# Altium schematic symbol library hphonglib.SchLib: 1131 symbols (part 2 of 8)
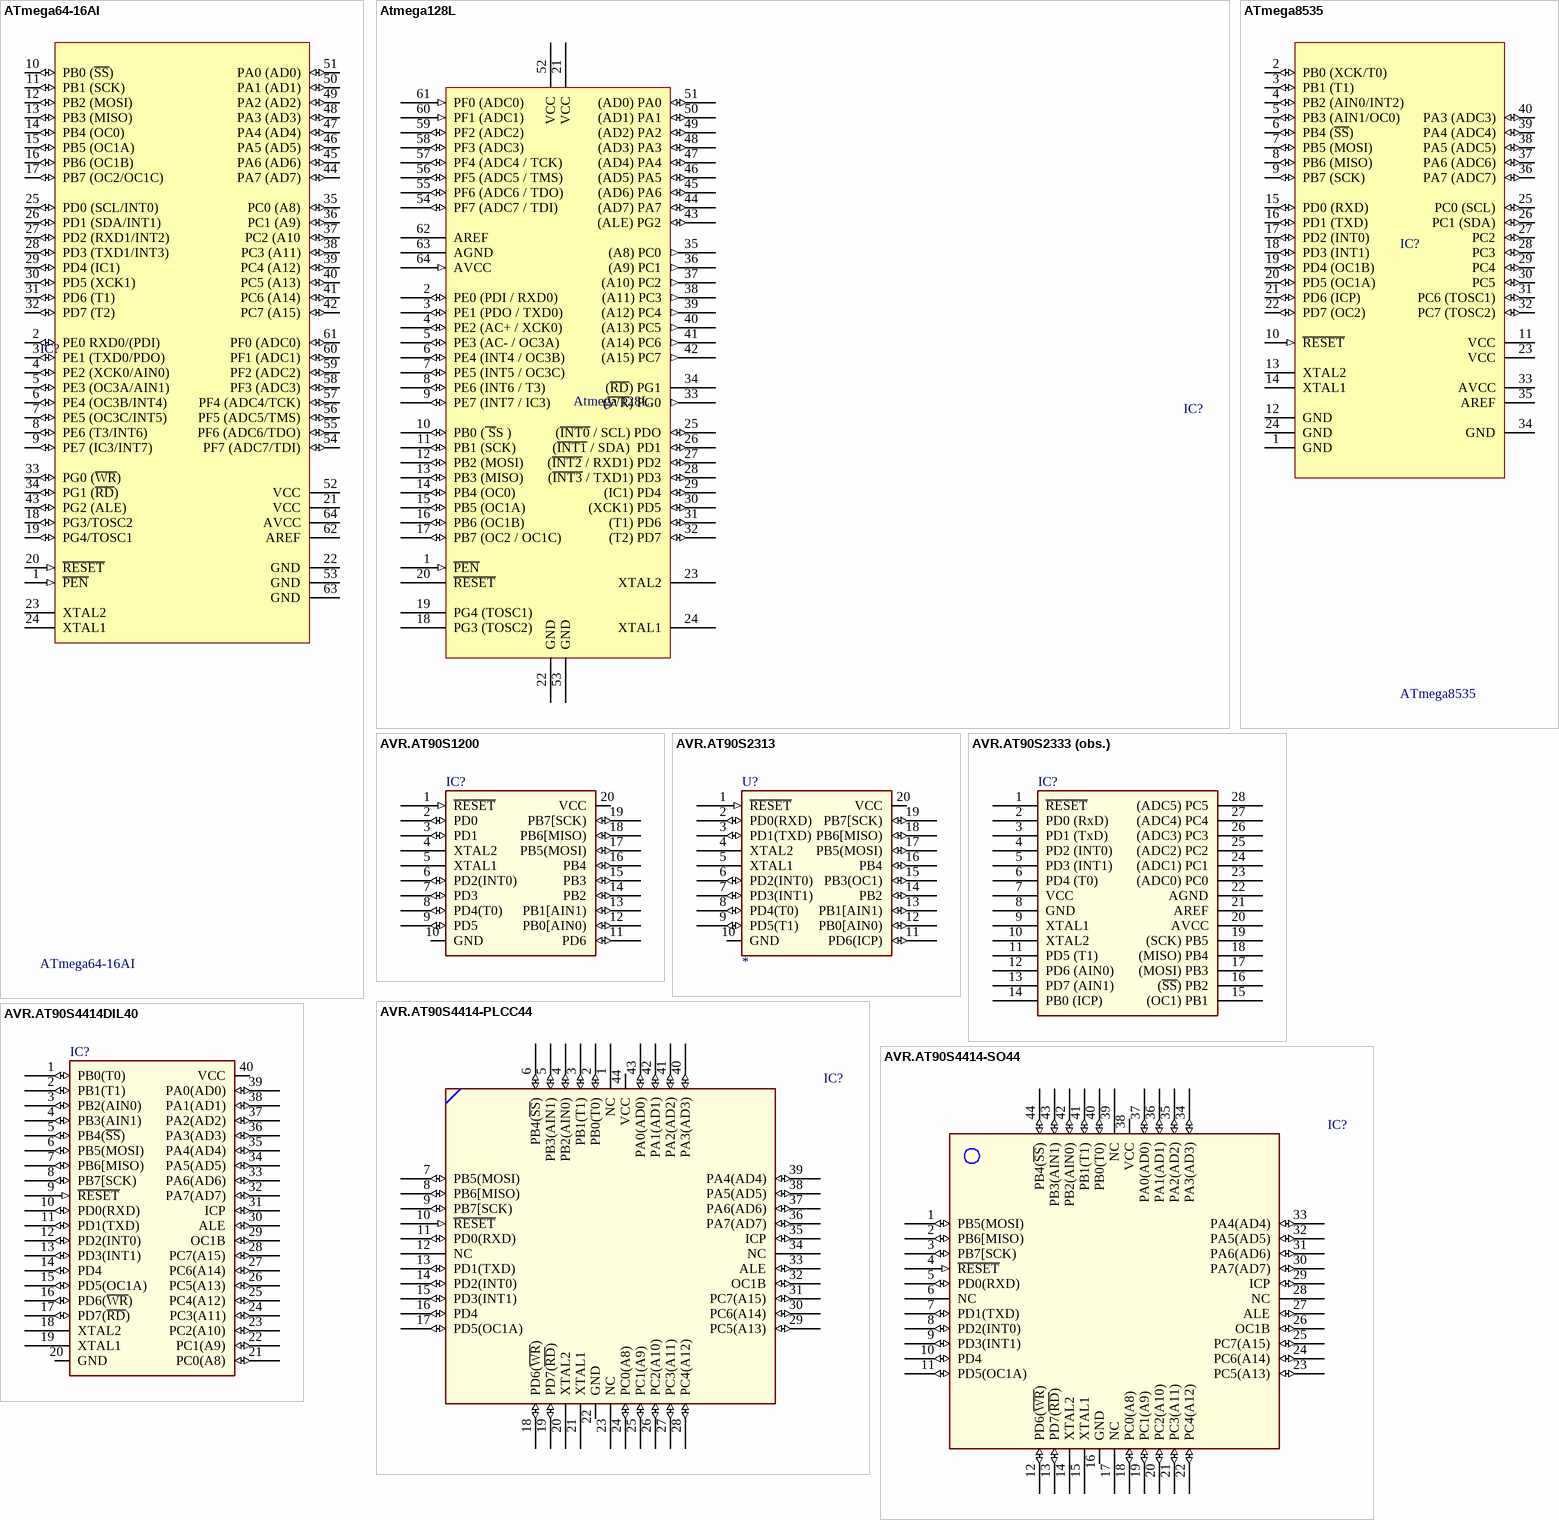
[diagram p50: symbols ATmega64-16AI to AVR.AT90S4414DIL40]

## AVR.AT90S2313
designator U?
Manufacturer: Atmel; Flash: Kb; SRAM: Bytes; Volt: V; CPU Speed (MIPS): 0 MIPS; ComponentLink1Description: Degikey Part link; ComponentLink2Description: Open DataSheet; ComponentLink2URL: H:\LIBRARY\LIBRARY.Datasheet\; Publisher: Hoang Nguyen
pins: 1 ~{RESET} (in), 2 PD0(RXD) (io), 3 PD1(TXD) (io), 4 XTAL2, 5 XTAL1, 6 PD2(INT0) (io), 7 PD3(INT1) (io), 8 PD4(T0) (io), 9 PD5(T1) (io), 10 GND, 11 PD6(ICP) (io), 12 PB0[AIN0) (io), 13 PB1[AIN1) (io), 14 PB2 (io), 15 PB3(OC1) (io), 16 PB4 (io), 17 PB5(MOSI) (io), 18 PB6[MISO) (io), 19 PB7[SCK) (io), 20 VCC

## AVR.AT90S2333 (obs.)
designator IC?  (value not drawn)
Manufacturer: Atmel; Flash: Kb; SRAM: Bytes; Volt: V; CPU Speed (MIPS): 0 MIPS; ComponentLink1Description: Degikey Part link; ComponentLink2Description: Open DataSheet; ComponentLink2URL: H:\LIBRARY\LIBRARY.Datasheet\; Publisher: Hoang Nguyen
footprint DIL28
pins: 1 ~{RESET} (hiz), 2 PD0 (RxD) (hiz), 3 PD1 (TxD) (hiz), 4 PD2 (INT0) (hiz), 5 PD3 (INT1) (hiz), 6 PD4 (T0) (hiz), 7 VCC, 8 GND, 9 XTAL1 (hiz), 10 XTAL2 (hiz), 11 PD5 (T1) (hiz), 12 PD6 (AIN0) (hiz), 13 PD7 (AIN1) (hiz), 14 PB0 (ICP) (hiz), 15 (OC1) PB1 (hiz), 16 (~{SS}) PB2 (hiz), 17 (MOSI) PB3 (hiz), 18 (MISO) PB4 (hiz), 19 (SCK) PB5 (hiz), 20 AVCC, 21 AREF, 22 AGND, 23 (ADC0) PC0 (hiz), 24 (ADC1) PC1 (hiz), 25 (ADC2) PC2 (hiz), 26 (ADC3) PC3 (hiz), 27 (ADC4) PC4 (hiz), 28 (ADC5) PC5 (hiz)

## AVR.AT90S4414-PLCC44
designator IC?  (value not drawn)
Manufacturer: Atmel; Flash: Kb; SRAM: Bytes; Volt: V; CPU Speed (MIPS): 0 MIPS; ComponentLink1Description: Degikey Part link; ComponentLink2Description: Open DataSheet; ComponentLink2URL: H:\LIBRARY\LIBRARY.Datasheet\; Publisher: Hoang Nguyen
pins: 1 NC, 2 PB0(T0) (io), 3 PB1(T1) (io), 4 PB2(AIN0) (io), 5 PB3(AIN1) (io), 6 PB4(~{SS}) (io), 7 PB5(MOSI) (io), 8 PB6[MISO) (io), 9 PB7[SCK) (io), 10 ~{RESET} (in), 11 PD0(RXD) (io), 12 NC, 13 PD1(TXD) (io), 14 PD2(INT0) (io), 15 PD3(INT1) (io), 16 PD4 (io), 17 PD5(OC1A) (io), 18 PD6(~{WR}) (io), 19 PD7(~{RD}) (io), 20 XTAL2, 21 XTAL1, 22 GND, 23 NC, 24 PC0(A8) (io), 25 PC1(A9) (io), 26 PC2(A10) (io), 27 PC3(A11) (io), 28 PC4(A12) (io), 29 PC5(A13) (io), 30 PC6(A14) (io), 31 PC7(A15) (io), 32 OC1B (io), 33 ALE (io), 34 NC, 35 ICP (io), 36 PA7(AD7) (io), 37 PA6(AD6) (io), 38 PA5(AD5) (io), 39 PA4(AD4) (io), 40 PA3(AD3) (io), 41 PA2(AD2) (io), 42 PA1(AD1) (io), 43 PA0(AD0) (io), 44 VCC

## AVR.AT90S4414-SO44
designator IC?  (value not drawn)
Manufacturer: Atmel; Flash: Kb; SRAM: Bytes; Volt: V; CPU Speed (MIPS): 0 MIPS; ComponentLink1Description: Degikey Part link; ComponentLink2Description: Open DataSheet; ComponentLink2URL: H:\LIBRARY\LIBRARY.Datasheet\; Publisher: Hoang Nguyen
pins: 1 PB5(MOSI) (io), 2 PB6[MISO) (io), 3 PB7[SCK) (io), 4 ~{RESET} (in), 5 PD0(RXD) (io), 6 NC, 7 PD1(TXD) (io), 8 PD2(INT0) (io), 9 PD3(INT1) (io), 10 PD4 (io), 11 PD5(OC1A) (io), 12 PD6(~{WR}) (io), 13 PD7(~{RD}) (io), 14 XTAL2, 15 XTAL1, 16 GND, 17 NC, 18 PC0(A8) (io), 19 PC1(A9) (io), 20 PC2(A10) (io), 21 PC3(A11) (io), 22 PC4(A12) (io), 23 PC5(A13) (io), 24 PC6(A14) (io), 25 PC7(A15) (io), 26 OC1B (io), 27 ALE (io), 28 NC, 29 ICP (io), 30 PA7(AD7) (io), 31 PA6(AD6) (io), 32 PA5(AD5) (io), 33 PA4(AD4) (io), 34 PA3(AD3) (io), 35 PA2(AD2) (io), 36 PA1(AD1) (io), 37 PA0(AD0) (io), 38 VCC, 39 NC, 40 PB0(T0) (io), 41 PB1(T1) (io), 42 PB2(AIN0) (io), 43 PB3(AIN1) (io), 44 PB4(~{SS}) (io)

## AVR.AT90S4414DIL40
designator IC?  (value not drawn)
Manufacturer: Atmel; Flash: Kb; SRAM: Bytes; Volt: V; CPU Speed (MIPS): 0 MIPS; ComponentLink1Description: Degikey Part link; ComponentLink2Description: Open DataSheet; ComponentLink2URL: H:\LIBRARY\LIBRARY.Datasheet\; Publisher: Hoang Nguyen
pins: 1 PB0(T0) (io), 2 PB1(T1) (io), 3 PB2(AIN0) (io), 4 PB3(AIN1) (io), 5 PB4(~{SS}) (io), 6 PB5(MOSI) (io), 7 PB6[MISO) (io), 8 PB7[SCK) (io), 9 ~{RESET} (in), 10 PD0(RXD) (io), 11 PD1(TXD) (io), 12 PD2(INT0) (io), 13 PD3(INT1) (io), 14 PD4 (io), 15 PD5(OC1A) (io), 16 PD6(~{WR}) (io), 17 PD7(~{RD}) (io), 18 XTAL2, 19 XTAL1, 20 GND, 21 PC0(A8) (io), 22 PC1(A9) (io), 23 PC2(A10) (io), 24 PC3(A11) (io), 25 PC4(A12) (io), 26 PC5(A13) (io), 27 PC6(A14) (io), 28 PC7(A15) (io), 29 OC1B (io), 30 ALE (io), 31 ICP (io), 32 PA7(AD7) (io), 33 PA6(AD6) (io), 34 PA5(AD5) (io), 35 PA4(AD4) (io), 36 PA3(AD3) (io), 37 PA2(AD2) (io), 38 PA1(AD1) (io), 39 PA0(AD0) (io), 40 VCC

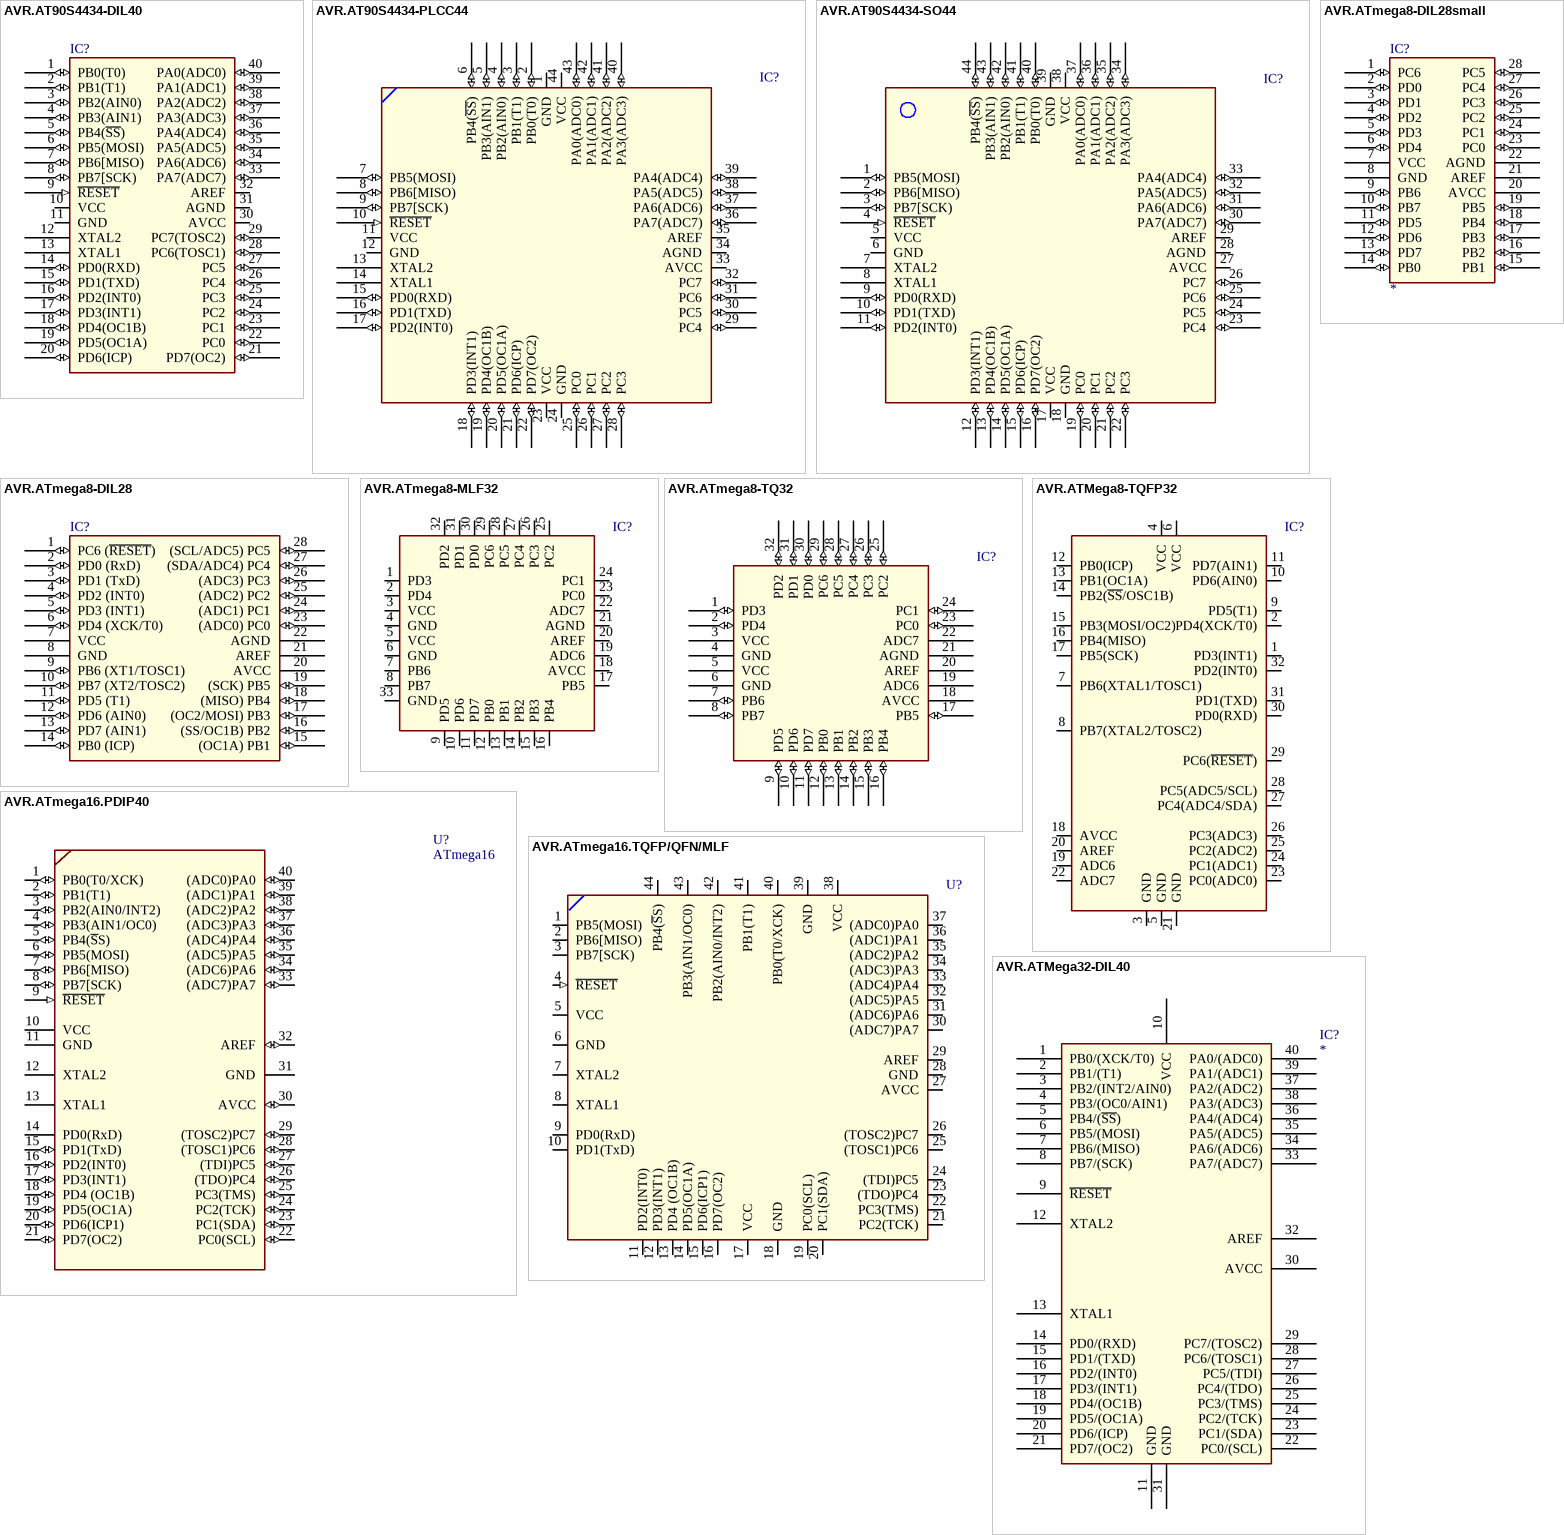
[diagram p7: symbols AVR.AT90S4434-DIL40 to AVR.ATMega32-DIL40]

## AVR.AT90S4434-DIL40
designator IC?  (value not drawn)
Manufacturer: Atmel; Flash: Kb; SRAM: Bytes; Volt: V; CPU Speed (MIPS): 0 MIPS; ComponentLink1Description: Degikey Part link; ComponentLink2Description: Open DataSheet; ComponentLink2URL: H:\LIBRARY\LIBRARY.Datasheet\; Publisher: Hoang Nguyen
footprint DIL40
pins: 1 PB0(T0) (io), 2 PB1(T1) (io), 3 PB2(AIN0) (io), 4 PB3(AIN1) (io), 5 PB4(~{SS}) (io), 6 PB5(MOSI) (io), 7 PB6[MISO) (io), 8 PB7[SCK) (io), 9 ~{RESET} (in), 10 VCC, 11 GND, 12 XTAL2, 13 XTAL1, 14 PD0(RXD) (io), 15 PD1(TXD) (io), 16 PD2(INT0) (io), 17 PD3(INT1) (io), 18 PD4(OC1B) (io), 19 PD5(OC1A) (io), 20 PD6(ICP) (io), 21 PD7(OC2) (io), 22 PC0 (io), 23 PC1 (io), 24 PC2 (io), 25 PC3 (io), 26 PC4 (io), 27 PC5 (io), 28 PC6(TOSC1) (io), 29 PC7(TOSC2) (io), 30 AVCC, 31 AGND, 32 AREF, 33 PA7(ADC7) (io), 34 PA6(ADC6) (io), 35 PA5(ADC5) (io), 36 PA4(ADC4) (io), 37 PA3(ADC3) (io), 38 PA2(ADC2) (io), 39 PA1(ADC1) (io), 40 PA0(ADC0) (io)

## AVR.AT90S4434-PLCC44
designator IC?  (value not drawn)
Manufacturer: Atmel; Flash: Kb; SRAM: Bytes; Volt: V; CPU Speed (MIPS): 0 MIPS; ComponentLink1Description: Degikey Part link; ComponentLink2Description: Open DataSheet; ComponentLink2URL: H:\LIBRARY\LIBRARY.Datasheet\; Publisher: Hoang Nguyen
footprint PLCC44
pins: 1 GND, 2 PB0(T0) (io), 3 PB1(T1) (io), 4 PB2(AIN0) (io), 5 PB3(AIN1) (io), 6 PB4(~{SS}) (io), 7 PB5(MOSI) (io), 8 PB6[MISO) (io), 9 PB7[SCK) (io), 10 ~{RESET} (in), 11 VCC, 12 GND, 13 XTAL2, 14 XTAL1, 15 PD0(RXD) (io), 16 PD1(TXD) (io), 17 PD2(INT0) (io), 18 PD3(INT1) (io), 19 PD4(OC1B) (io), 20 PD5(OC1A) (io), 21 PD6(ICP) (io), 22 PD7(OC2) (io), 23 VCC, 24 GND, 25 PC0 (io), 26 PC1 (io), 27 PC2 (io), 28 PC3 (io), 29 PC4 (io), 30 PC5 (io), 31 PC6 (io), 32 PC7 (io), 33 AVCC, 34 AGND, 35 AREF, 36 PA7(ADC7) (io), 37 PA6(ADC6) (io), 38 PA5(ADC5) (io), 39 PA4(ADC4) (io), 40 PA3(ADC3) (io), 41 PA2(ADC2) (io), 42 PA1(ADC1) (io), 43 PA0(ADC0) (io), 44 VCC

## AVR.AT90S4434-SO44
designator IC?  (value not drawn)
Manufacturer: Atmel; Flash: Kb; SRAM: Bytes; Volt: V; CPU Speed (MIPS): 0 MIPS; ComponentLink1Description: Degikey Part link; ComponentLink2Description: Open DataSheet; ComponentLink2URL: H:\LIBRARY\LIBRARY.Datasheet\; Publisher: Hoang Nguyen
footprint SO44
pins: 1 PB5(MOSI) (io), 2 PB6[MISO) (io), 3 PB7[SCK) (io), 4 ~{RESET} (in), 5 VCC, 6 GND, 7 XTAL2, 8 XTAL1, 9 PD0(RXD) (io), 10 PD1(TXD) (io), 11 PD2(INT0) (io), 12 PD3(INT1) (io), 13 PD4(OC1B) (io), 14 PD5(OC1A) (io), 15 PD6(ICP) (io), 16 PD7(OC2) (io), 17 VCC, 18 GND, 19 PC0 (io), 20 PC1 (io), 21 PC2 (io), 22 PC3 (io), 23 PC4 (io), 24 PC5 (io), 25 PC6 (io), 26 PC7 (io), 27 AVCC, 28 AGND, 29 AREF, 30 PA7(ADC7) (io), 31 PA6(ADC6) (io), 32 PA5(ADC5) (io), 33 PA4(ADC4) (io), 34 PA3(ADC3) (io), 35 PA2(ADC2) (io), 36 PA1(ADC1) (io), 37 PA0(ADC0) (io), 38 VCC, 39 GND, 40 PB0(T0) (io), 41 PB1(T1) (io), 42 PB2(AIN0) (io), 43 PB3(AIN1) (io), 44 PB4(~{SS}) (io)

## AVR.ATmega8-DIL28
designator IC?  (value not drawn)
Manufacturer: Atmel; Flash: Kb; SRAM: Bytes; Volt: V; CPU Speed (MIPS): 0 MIPS; ComponentLink1Description: Degikey Part link; ComponentLink2Description: Open DataSheet; ComponentLink2URL: H:\LIBRARY\LIBRARY.Datasheet\; Publisher: Hoang Nguyen
footprint DIL28
pins: 1 PC6 (~{RESET}) (io), 2 PD0 (RxD) (io), 3 PD1 (TxD) (io), 4 PD2 (INT0) (io), 5 PD3 (INT1) (io), 6 PD4 (XCK/T0) (io), 7 VCC, 8 GND, 9 PB6 (XT1/TOSC1) (io), 10 PB7 (XT2/TOSC2) (io), 11 PD5 (T1) (io), 12 PD6 (AIN0) (io), 13 PD7 (AIN1) (io), 14 PB0 (ICP) (io), 15 (OC1A) PB1 (io), 16 (SS/OC1B) PB2 (io), 17 (OC2/MOSI) PB3 (io), 18 (MISO) PB4 (io), 19 (SCK) PB5 (io), 20 AVCC, 21 AREF, 22 AGND, 23 (ADC0) PC0 (io), 24 (ADC1) PC1 (io), 25 (ADC2) PC2 (io), 26 (ADC3) PC3 (io), 27 (SDA/ADC4) PC4 (io), 28 (SCL/ADC5) PC5 (io)

## AVR.ATmega8-DIL28small
designator IC?
Manufacturer: Atmel; Flash: Kb; SRAM: Bytes; Volt: V; CPU Speed (MIPS): 0 MIPS; ComponentLink1Description: Degikey Part link; ComponentLink2Description: Open DataSheet; ComponentLink2URL: H:\LIBRARY\LIBRARY.Datasheet\; Publisher: Hoang Nguyen
footprint DIP300-28 (DIP, Plastic, Skinny; 28 Leads; Row Spacing 7.62 mm; Pitch 2.54 mm)
pins: 1 PC6 (io), 2 PD0 (io), 3 PD1 (io), 4 PD2 (io), 5 PD3 (io), 6 PD4 (io), 7 VCC, 8 GND, 9 PB6 (io), 10 PB7 (io), 11 PD5 (io), 12 PD6 (io), 13 PD7 (io), 14 PB0 (io), 15 PB1 (io), 16 PB2 (io), 17 PB3 (io), 18 PB4 (io), 19 PB5 (io), 20 AVCC, 21 AREF, 22 AGND, 23 PC0 (io), 24 PC1 (io), 25 PC2 (io), 26 PC3 (io), 27 PC4 (io), 28 PC5 (io)

## AVR.ATmega8-MLF32
designator IC?  (value not drawn)
Manufacturer: Atmel; Flash: Kb; SRAM: Bytes; Volt: V; CPU Speed (MIPS): 0 MIPS; ComponentLink1Description: Degikey Part link; ComponentLink2Description: Open DataSheet; ComponentLink2URL: H:\LIBRARY\LIBRARY.Datasheet\; Publisher: Hoang Nguyen
footprint MLF32
pins: 1 PD3 (io), 2 PD4 (io), 3 VCC, 4 GND, 5 VCC, 6 GND, 7 PB6 (io), 8 PB7 (io), 9 PD5 (io), 10 PD6 (io), 11 PD7 (io), 12 PB0 (io), 13 PB1 (io), 14 PB2 (io), 15 PB3 (io), 16 PB4 (io), 17 PB5 (io), 18 AVCC, 19 ADC6, 20 AREF, 21 AGND, 22 ADC7, 23 PC0 (io), 24 PC1 (io), 25 PC2 (io), 26 PC3 (io), 27 PC4 (io), 28 PC5 (io), 29 PC6 (io), 30 PD0 (io), 31 PD1 (io), 32 PD2 (io), 33 GND

## AVR.ATmega8-TQ32
designator IC?  (value not drawn)
Manufacturer: Atmel; Flash: Kb; SRAM: Bytes; Volt: V; CPU Speed (MIPS): 0 MIPS; ComponentLink1Description: Degikey Part link; ComponentLink2Description: Open DataSheet; ComponentLink2URL: H:\LIBRARY\LIBRARY.Datasheet\; Publisher: Hoang Nguyen
footprint TQFP32
pins: 1 PD3 (io), 2 PD4 (io), 3 VCC, 4 GND, 5 VCC, 6 GND, 7 PB6 (io), 8 PB7 (io), 9 PD5 (io), 10 PD6 (io), 11 PD7 (io), 12 PB0 (io), 13 PB1 (io), 14 PB2 (io), 15 PB3 (io), 16 PB4 (io), 17 PB5 (io), 18 AVCC, 19 ADC6, 20 AREF, 21 AGND, 22 ADC7, 23 PC0 (io), 24 PC1 (io), 25 PC2 (io), 26 PC3 (io), 27 PC4 (io), 28 PC5 (io), 29 PC6 (io), 30 PD0 (io), 31 PD1 (io), 32 PD2 (io)

## AVR.ATMega8-TQFP32
designator IC?  (value not drawn)
Manufacturer: Atmel; Flash: Kb; SRAM: Bytes; Volt: V; CPU Speed (MIPS): 0 MIPS; ComponentLink1Description: Degikey Part link; ComponentLink2Description: Open DataSheet; ComponentLink2URL: H:\LIBRARY\LIBRARY.Datasheet\; Publisher: Hoang Nguyen
pins: 1 PD3(INT1), 2 PD4(XCK/T0), 3 GND, 4 VCC, 5 GND, 6 VCC, 7 PB6(XTAL1/TOSC1), 8 PB7(XTAL2/TOSC2), 9 PD5(T1), 10 PD6(AIN0), 11 PD7(AIN1), 12 PB0(ICP), 13 PB1(OC1A), 14 PB2(~{SS}/OSC1B), 15 PB3(MOSI/OC2), 16 PB4(MISO), 17 PB5(SCK), 18 AVCC, 19 ADC6, 20 AREF, 21 GND, 22 ADC7, 23 PC0(ADC0), 24 PC1(ADC1), 25 PC2(ADC2), 26 PC3(ADC3), 27 PC4(ADC4/SDA), 28 PC5(ADC5/SCL), 29 PC6(~{RESET}), 30 PD0(RXD), 31 PD1(TXD), 32 PD2(INT0)

## AVR.ATmega16.PDIP40
designator U?, comment ATmega16
8-bit ATmega16; Manufacturer: Atmel; Flash: Kb; SRAM: Bytes; Volt: V; CPU Speed (MIPS): 0 MIPS; ComponentLink1Description: Degikey Part link; ComponentLink2Description: Open DataSheet; ComponentLink2URL: H:\LIBRARY\LIBRARY.Datasheet\ATmega16.pdf; Publisher: Hoang Nguyen
footprint DIP600-40 (DIP, Plastic; 40 Leads; Row Spacing 15.24 mm; Pitch 2.54 mm)
pins: 1 PB0(T0/XCK) (io), 2 PB1(T1) (io), 3 PB2(AIN0/INT2) (io), 4 PB3(AIN1/OC0) (io), 5 PB4(~{S}S) (io), 6 PB5(MOSI) (io), 7 PB6[MISO) (io), 8 PB7[SCK) (io), 9 ~{RESET} (in), 10 VCC (power), 11 GND (power), 12 XTAL2, 13 XTAL1, 14 PD0(RxD), 15 PD1(TxD) (io), 16 PD2(INT0) (io), 17 PD3(INT1) (io), 18 PD4 (OC1B) (io), 19 PD5(OC1A) (io), 20 PD6(ICP1) (io), 21 PD7(OC2) (io), 22 PC0(SCL) (io), 23 PC1(SDA) (io), 24 PC2(TCK) (io), 25 PC3(TMS) (io), 26 (TDO)PC4 (io), 27 (TDI)PC5 (io), 28 (TOSC1)PC6 (io), 29 (TOSC2)PC7 (io), 30 AVCC (io), 31 GND, 32 AREF (io), 33 (ADC7)PA7 (io), 34 (ADC6)PA6 (io), 35 (ADC5)PA5 (io), 36 (ADC4)PA4 (io), 37 (ADC3)PA3 (io), 38 (ADC2)PA2 (io), 39 (ADC1)PA1 (io), 40 (ADC0)PA0 (io)

## AVR.ATmega16.TQFP/QFN/MLF
designator U?  (value not drawn)
Manufacturer: Atmel; Flash: Kb; SRAM: Bytes; Volt: V; CPU Speed (MIPS): 0 MIPS; ComponentLink1Description: Degikey Part link; ComponentLink2Description: Open DataSheet; ComponentLink2URL: H:\LIBRARY\LIBRARY.Datasheet\ATmega16.pdf; Publisher: Hoang Nguyen
footprint TQFP44
pins: 1 PB5(MOSI) (io), 2 PB6[MISO) (io), 3 PB7[SCK) (io), 4 ~{RESET} (in), 5 VCC, 6 GND, 7 XTAL2, 8 XTAL1, 9 PD0(RxD), 10 PD1(TxD) (io), 11 PD2(INT0) (io), 12 PD3(INT1) (io), 13 PD4 (OC1B) (io), 14 PD5(OC1A) (io), 15 PD6(ICP1) (io), 16 PD7(OC2) (io), 17 VCC, 18 GND, 19 PC0(SCL) (io), 20 PC1(SDA) (io), 21 PC2(TCK) (io), 22 PC3(TMS) (io), 23 (TDO)PC4 (io), 24 (TDI)PC5 (io), 25 (TOSC1)PC6 (io), 26 (TOSC2)PC7 (io), 27 AVCC (io), 28 GND, 29 AREF (io), 30 (ADC7)PA7 (io), 31 (ADC6)PA6 (io), 32 (ADC5)PA5 (io), 33 (ADC4)PA4 (io), 34 (ADC3)PA3 (io), 35 (ADC2)PA2 (io), 36 (ADC1)PA1 (io), 37 (ADC0)PA0 (io), 38 VCC, 39 GND, 40 PB0(T0/XCK) (io), 41 PB1(T1) (io), 42 PB2(AIN0/INT2) (io), 43 PB3(AIN1/OC0) (io), 44 PB4(~{S}S) (io)

## AVR.ATMega32-DIL40
designator IC?
Manufacturer: Atmel; Flash: Kb; SRAM: Bytes; Volt: V; CPU Speed (MIPS): 0 MIPS; ComponentLink1Description: Degikey Part link; ComponentLink2Description: Open DataSheet; ComponentLink2URL: H:\LIBRARY\LIBRARY.Datasheet\; Publisher: Hoang Nguyen
footprint DIP600-40 - With Name_N (DIP, Plastic; 40 Leads; Row Spacing 15.24 mm; Pitch 2.54 mm)
pins: 1 PB0/(XCK/T0), 2 PB1/(T1), 3 PB2/(INT2/AIN0), 4 PB3/(OC0/AIN1), 5 PB4/(~{SS}), 6 PB5/(MOSI), 7 PB6/(MISO), 8 PB7/(SCK), 9 ~{RESET}, 10 VCC, 11 GND, 12 XTAL2, 13 XTAL1, 14 PD0/(RXD), 15 PD1/(TXD), 16 PD2/(INT0), 17 PD3/(INT1), 18 PD4/(OC1B), 19 PD5/(OC1A), 20 PD6/(ICP), 21 PD7/(OC2), 22 PC0/(SCL), 23 PC1/(SDA), 24 PC2/(TCK), 25 PC3/(TMS), 26 PC4/(TDO), 27 PC5/(TDI), 28 PC6/(TOSC1), 29 PC7/(TOSC2), 30 AVCC, 31 GND, 32 AREF, 33 PA7/(ADC7), 34 PA6/(ADC6), 35 PA5/(ADC5), 36 PA4/(ADC4), 37 PA2/(ADC2), 38 PA3/(ADC3), 39 PA1/(ADC1), 40 PA0/(ADC0)

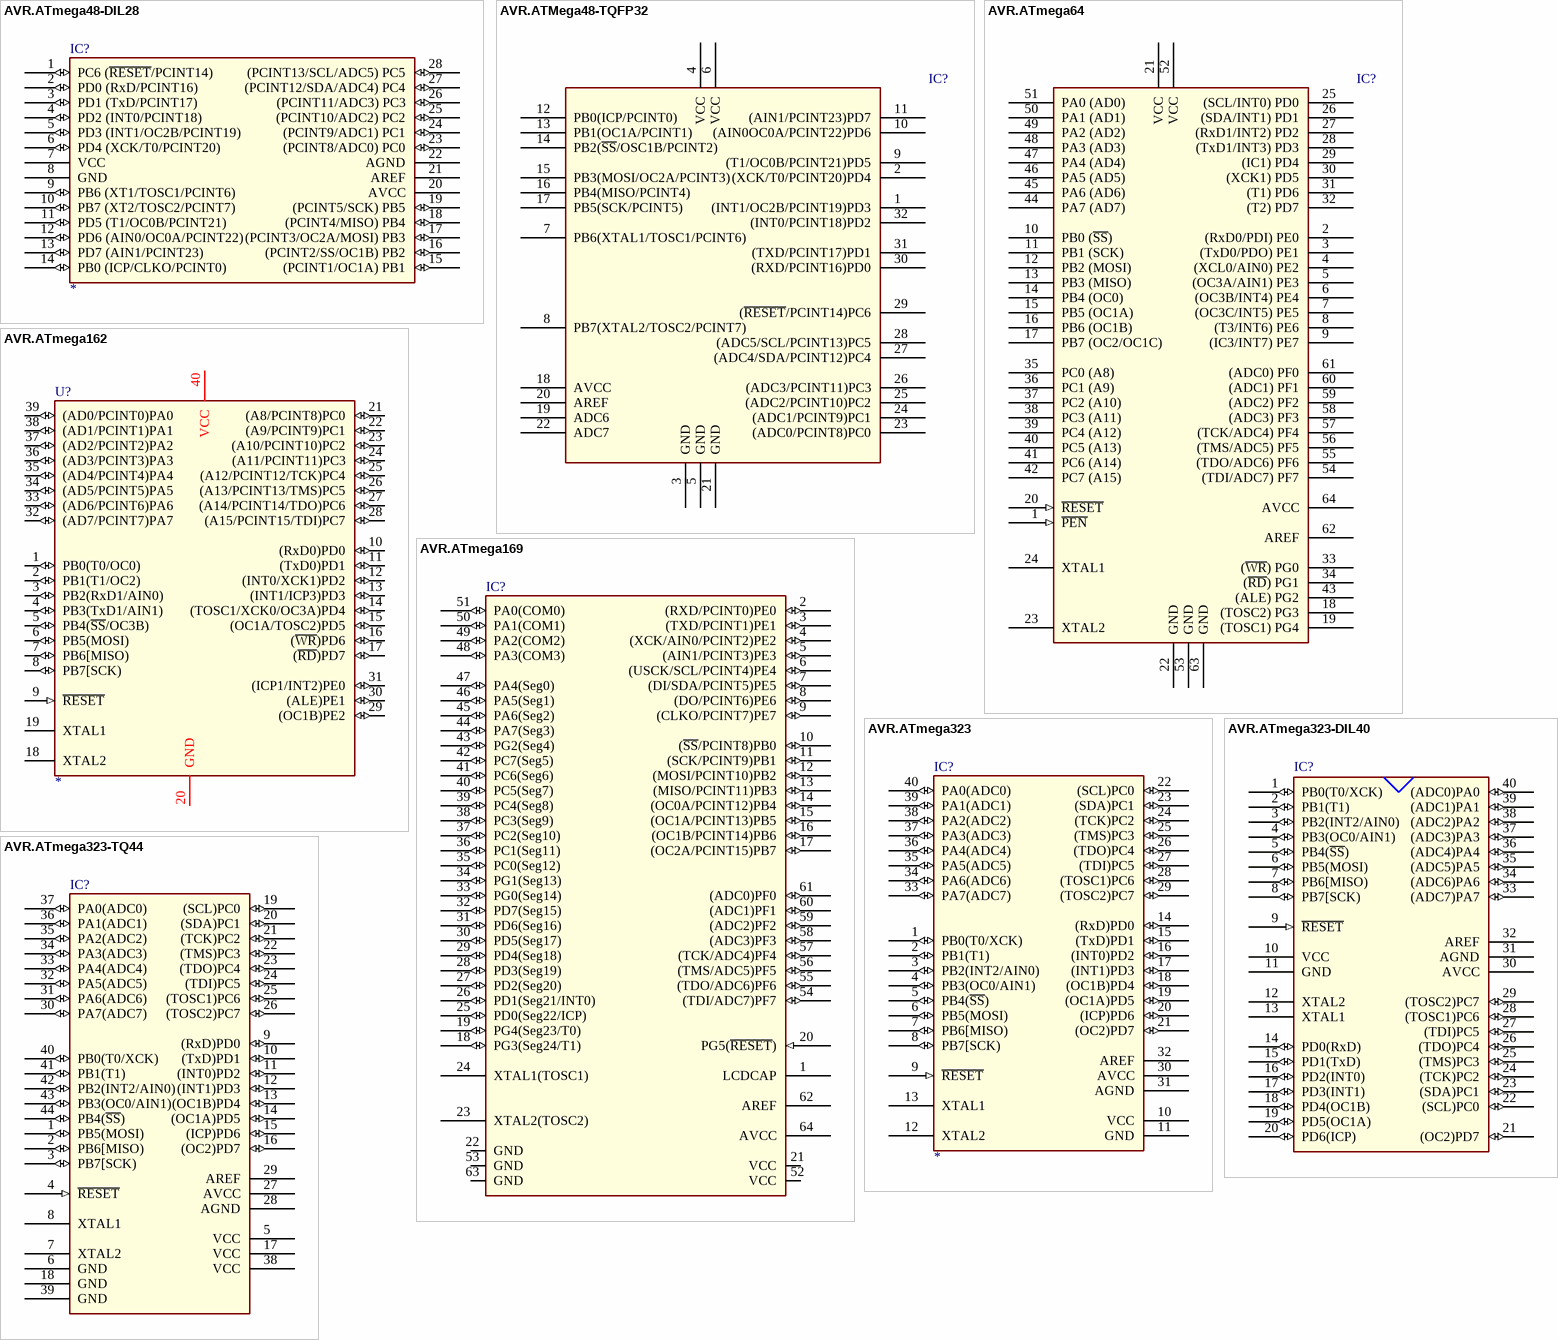
[diagram p8: symbols AVR.ATmega48-DIL28 to AVR.ATmega323-TQ44]

## AVR.ATmega48-DIL28
designator IC?
Manufacturer: Atmel; Flash: Kb; SRAM: Bytes; Volt: V; CPU Speed (MIPS): 0 MIPS; ComponentLink1Description: Degikey Part link; ComponentLink2Description: Open DataSheet; ComponentLink2URL: H:\LIBRARY\LIBRARY.Datasheet\; Publisher: Hoang Nguyen
footprint DIL28
pins: 1 PC6 (~{RESET}/PCINT14) (io), 2 PD0 (RxD/PCINT16) (io), 3 PD1 (TxD/PCINT17) (io), 4 PD2 (INT0/PCINT18) (io), 5 PD3 (INT1/OC2B/PCINT19) (io), 6 PD4 (XCK/T0/PCINT20) (io), 7 VCC, 8 GND, 9 PB6 (XT1/TOSC1/PCINT6) (io), 10 PB7 (XT2/TOSC2/PCINT7) (io), 11 PD5 (T1/OC0B/PCINT21) (io), 12 PD6 (AIN0/OC0A/PCINT22) (io), 13 PD7 (AIN1/PCINT23) (io), 14 PB0 (ICP/CLKO/PCINT0) (io), 15 (PCINT1/OC1A) PB1 (io), 16 (PCINT2/SS/OC1B) PB2 (io), 17 (PCINT3/OC2A/MOSI) PB3 (io), 18 (PCINT4/MISO) PB4 (io), 19 (PCINT5/SCK) PB5 (io), 20 AVCC, 21 AREF, 22 AGND, 23 (PCINT8/ADC0) PC0 (io), 24 (PCINT9/ADC1) PC1 (io), 25 (PCINT10/ADC2) PC2 (io), 26 (PCINT11/ADC3) PC3 (io), 27 (PCINT12/SDA/ADC4) PC4 (io), 28 (PCINT13/SCL/ADC5) PC5 (io)

## AVR.ATMega48-TQFP32
designator IC?  (value not drawn)
Manufacturer: Atmel; Flash: Kb; SRAM: Bytes; Volt: V; CPU Speed (MIPS): 0 MIPS; ComponentLink1Description: Degikey Part link; ComponentLink2Description: Open DataSheet; ComponentLink2URL: H:\LIBRARY\LIBRARY.Datasheet\; Publisher: Hoang Nguyen
footprint TQFP32
pins: 1 (INT1/OC2B/PCINT19)PD3, 2 (XCK/T0/PCINT20)PD4, 3 GND, 4 VCC, 5 GND, 6 VCC, 7 PB6(XTAL1/TOSC1/PCINT6), 8 PB7(XTAL2/TOSC2/PCINT7), 9 (T1/OC0B/PCINT21)PD5, 10 (AIN0OC0A/PCINT22)PD6, 11 (AIN1/PCINT23)PD7, 12 PB0(ICP/PCINT0), 13 PB1(OC1A/PCINT1), 14 PB2(~{SS}/OSC1B/PCINT2), 15 PB3(MOSI/OC2A/PCINT3), 16 PB4(MISO/PCINT4), 17 PB5(SCK/PCINT5), 18 AVCC, 19 ADC6, 20 AREF, 21 GND, 22 ADC7, 23 (ADC0/PCINT8)PC0, 24 (ADC1/PCINT9)PC1, 25 (ADC2/PCINT10)PC2, 26 (ADC3/PCINT11)PC3, 27 (ADC4/SDA/PCINT12)PC4, 28 (ADC5/SCL/PCINT13)PC5, 29 (~{RESET}/PCINT14)PC6, 30 (RXD/PCINT16)PD0, 31 (TXD/PCINT17)PD1, 32 (INT0/PCINT18)PD2

## AVR.ATmega64
designator IC?  (value not drawn)
Manufacturer: Atmel; Flash: Kb; SRAM: Bytes; Volt: V; CPU Speed (MIPS): 0 MIPS; ComponentLink1Description: Degikey Part link; ComponentLink2Description: Open DataSheet; ComponentLink2URL: H:\LIBRARY\LIBRARY.Datasheet\; Publisher: Hoang Nguyen
footprint QFP14X14_64
pins: 1 ~{PEN} (in), 2 (RxD0/PDI) PE0 (hiz), 3 (TxD0/PDO) PE1 (hiz), 4 (XCL0/AIN0) PE2 (hiz), 5 (OC3A/AIN1) PE3 (hiz), 6 (OC3B/INT4) PE4 (hiz), 7 (OC3C/INT5) PE5 (hiz), 8 (T3/INT6) PE6 (hiz), 9 (IC3/INT7) PE7 (hiz), 10 PB0 (~{SS}) (hiz), 11 PB1 (SCK) (hiz), 12 PB2 (MOSI) (hiz), 13 PB3 (MISO) (hiz), 14 PB4 (OC0) (hiz), 15 PB5 (OC1A) (hiz), 16 PB6 (OC1B) (hiz), 17 PB7 (OC2/OC1C) (hiz), 18 (TOSC2) PG3 (hiz), 19 (TOSC1) PG4 (hiz), 20 ~{RESET} (in), 21 VCC, 22 GND, 23 XTAL2, 24 XTAL1, 25 (SCL/INT0) PD0 (hiz), 26 (SDA/INT1) PD1 (hiz), 27 (RxD1/INT2) PD2 (hiz), 28 (TxD1/INT3) PD3 (hiz), 29 (IC1) PD4 (hiz), 30 (XCK1) PD5 (hiz), 31 (T1) PD6 (hiz), 32 (T2) PD7 (hiz), 33 (~{WR}) PG0 (hiz), 34 (~{RD}) PG1 (hiz), 35 PC0 (A8) (hiz), 36 PC1 (A9) (hiz), 37 PC2 (A10) (hiz), 38 PC3 (A11) (hiz), 39 PC4 (A12) (hiz), 40 PC5 (A13) (hiz), 41 PC6 (A14) (hiz), 42 PC7 (A15) (hiz), 43 (ALE) PG2 (hiz), 44 PA7 (AD7) (hiz), 45 PA6 (AD6) (hiz), 46 PA5 (AD5) (hiz), 47 PA4 (AD4) (hiz), 48 PA3 (AD3) (hiz), 49 PA2 (AD2) (hiz), 50 PA1 (AD1) (hiz), 51 PA0 (AD0) (hiz), 52 VCC, 53 GND, 54 (TDI/ADC7) PF7 (hiz), 55 (TDO/ADC6) PF6 (hiz), 56 (TMS/ADC5) PF5 (hiz), 57 (TCK/ADC4) PF4 (hiz), 58 (ADC3) PF3 (hiz), 59 (ADC2) PF2 (hiz), 60 (ADC1) PF1 (hiz), 61 (ADC0) PF0 (hiz), 62 AREF, 63 GND, 64 AVCC

## AVR.ATmega162
designator U?
Manufacturer: Atmel; Flash: 16 Kb; SRAM: 1024 Bytes; Volt: 1.8-5.5V; CPU Speed (MIPS): 0 MIPS; ComponentLink1Description: Degikey Part link; ComponentLink2Description: Open DataSheet; ComponentLink2URL: H:\LIBRARY\LIBRARY.Datasheet\mega162.pdf; Publisher: Hoang Nguyen
footprint DIP600-40 (DIP, Plastic; 40 Leads; Row Spacing 15.24 mm; Pitch 2.54 mm)
footprint TQFP-44_M - At162 (Thin QFP, 44-Leads, Body 10x10mm, Pitch 0.8mm, IPC Low Density)
pins: 1 PB0(T0/OC0) (io), 2 PB1(T1/OC2) (io), 3 PB2(RxD1/AIN0) (io), 4 PB3(TxD1/AIN1) (io), 5 PB4(~{SS}/OC3B) (io), 6 PB5(MOSI) (io), 7 PB6[MISO) (io), 8 PB7[SCK) (io), 9 ~{RESET} (in), 10 (RxD0)PD0 (io), 11 (TxD0)PD1 (io), 12 (INT0/XCK1)PD2 (io), 13 (INT1/ICP3)PD3 (io), 14 (TOSC1/XCK0/OC3A)PD4 (io), 15 (OC1A/TOSC2)PD5 (io), 16 (~{WR})PD6 (io), 17 (~{RD})PD7 (io), 18 XTAL2, 19 XTAL1, 20 GND (power), 21 (A8/PCINT8)PC0 (io), 22 (A9/PCINT9)PC1 (io), 23 (A10/PCINT10)PC2 (io), 24 (A11/PCINT11)PC3 (io), 25 (A12/PCINT12/TCK)PC4 (io), 26 (A13/PCINT13/TMS)PC5 (io), 27 (A14/PCINT14/TDO)PC6 (io), 28 (A15/PCINT15/TDI)PC7 (io), 29 (OC1B)PE2 (io), 30 (ALE)PE1 (io), 31 (ICP1/INT2)PE0 (io), 32 (AD7/PCINT7)PA7 (io), 33 (AD6/PCINT6)PA6 (io), 34 (AD5/PCINT5)PA5 (io), 35 (AD4/PCINT4)PA4 (io), 36 (AD3/PCINT3)PA3 (io), 37 (AD2/PCINT2)PA2 (io), 38 (AD1/PCINT1)PA1 (io), 39 (AD0/PCINT0)PA0 (io), 40 VCC

## AVR.ATmega169
designator IC?  (value not drawn)
Manufacturer: Atmel; Flash: Kb; SRAM: Bytes; Volt: V; CPU Speed (MIPS): 0 MIPS; ComponentLink1Description: Degikey Part link; ComponentLink2Description: Open DataSheet; ComponentLink2URL: H:\LIBRARY\LIBRARY.Datasheet\; Publisher: Hoang Nguyen
footprint MLF64
pins: 1 LCDCAP, 2 (RXD/PCINT0)PE0 (io), 3 (TXD/PCINT1)PE1 (io), 4 (XCK/AIN0/PCINT2)PE2 (io), 5 (AIN1/PCINT3)PE3 (io), 6 (USCK/SCL/PCINT4)PE4 (io), 7 (DI/SDA/PCINT5)PE5 (io), 8 (DO/PCINT6)PE6 (io), 9 (CLKO/PCINT7)PE7 (io), 10 (~{SS}/PCINT8)PB0 (io), 11 (SCK/PCINT9)PB1 (io), 12 (MOSI/PCINT10)PB2 (io), 13 (MISO/PCINT11)PB3 (io), 14 (OC0A/PCINT12)PB4 (io), 15 (OC1A/PCINT13)PB5 (io), 16 (OC1B/PCINT14)PB6 (io), 17 (OC2A/PCINT15)PB7 (io), 18 PG3(Seg24/T1) (io), 19 PG4(Seg23/T0) (io), 20 PG5(~{RESET}) (in), 21 VCC, 22 GND, 23 XTAL2(TOSC2), 24 XTAL1(TOSC1), 25 PD0(Seg22/ICP) (io), 26 PD1(Seg21/INT0) (io), 27 PD2(Seg20) (io), 28 PD3(Seg19) (io), 29 PD4(Seg18) (io), 30 PD5(Seg17) (io), 31 PD6(Seg16) (io), 32 PD7(Seg15) (io), 33 PG0(Seg14) (io), 34 PG1(Seg13) (io), 35 PC0(Seg12) (io), 36 PC1(Seg11) (io), 37 PC2(Seg10) (io), 38 PC3(Seg9) (io), 39 PC4(Seg8) (io), 40 PC5(Seg7) (io), 41 PC6(Seg6) (io), 42 PC7(Seg5) (io), 43 PG2(Seg4) (io), 44 PA7(Seg3) (io), 45 PA6(Seg2) (io), 46 PA5(Seg1) (io), 47 PA4(Seg0) (io), 48 PA3(COM3) (io), 49 PA2(COM2) (io), 50 PA1(COM1) (io), 51 PA0(COM0) (io), 52 VCC, 53 GND, 54 (TDI/ADC7)PF7 (io), 55 (TDO/ADC6)PF6 (io), 56 (TMS/ADC5)PF5 (io), 57 (TCK/ADC4)PF4 (io), 58 (ADC3)PF3 (io), 59 (ADC2)PF2 (io), 60 (ADC1)PF1 (io), 61 (ADC0)PF0 (io), 62 AREF, 63 GND, 64 AVCC

## AVR.ATmega323
designator IC?
Manufacturer: Atmel; Flash: Kb; SRAM: Bytes; Volt: V; CPU Speed (MIPS): 0 MIPS; ComponentLink1Description: Degikey Part link; ComponentLink2Description: Open DataSheet; ComponentLink2URL: H:\LIBRARY\LIBRARY.Datasheet\; Publisher: Hoang Nguyen
footprint DIL40
pins: 1 PB0(T0/XCK) (io), 2 PB1(T1) (io), 3 PB2(INT2/AIN0) (io), 4 PB3(OC0/AIN1) (io), 5 PB4(~{SS}) (io), 6 PB5(MOSI) (io), 7 PB6[MISO) (io), 8 PB7[SCK) (io), 9 ~{RESET} (in), 10 VCC, 11 GND, 12 XTAL2, 13 XTAL1, 14 (RxD)PD0 (io), 15 (TxD)PD1 (io), 16 (INT0)PD2 (io), 17 (INT1)PD3 (io), 18 (OC1B)PD4 (io), 19 (OC1A)PD5 (io), 20 (ICP)PD6 (io), 21 (OC2)PD7 (io), 22 (SCL)PC0 (io), 23 (SDA)PC1 (io), 24 (TCK)PC2 (io), 25 (TMS)PC3 (io), 26 (TDO)PC4 (io), 27 (TDI)PC5 (io), 28 (TOSC1)PC6 (io), 29 (TOSC2)PC7 (io), 30 AVCC, 31 AGND, 32 AREF, 33 PA7(ADC7) (io), 34 PA6(ADC6) (io), 35 PA5(ADC5) (io), 36 PA4(ADC4) (io), 37 PA3(ADC3) (io), 38 PA2(ADC2) (io), 39 PA1(ADC1) (io), 40 PA0(ADC0) (io)

## AVR.ATmega323-DIL40
designator IC?  (value not drawn)
Manufacturer: Atmel; Flash: Kb; SRAM: Bytes; Volt: V; CPU Speed (MIPS): 0 MIPS; ComponentLink1Description: Degikey Part link; ComponentLink2Description: Open DataSheet; ComponentLink2URL: H:\LIBRARY\LIBRARY.Datasheet\; Publisher: Hoang Nguyen
footprint DIL40
pins: 1 PB0(T0/XCK) (io), 2 PB1(T1) (io), 3 PB2(INT2/AIN0) (io), 4 PB3(OC0/AIN1) (io), 5 PB4(~{SS}) (io), 6 PB5(MOSI) (io), 7 PB6[MISO) (io), 8 PB7[SCK) (io), 9 ~{RESET} (in), 10 VCC, 11 GND, 12 XTAL2, 13 XTAL1, 14 PD0(RxD) (io), 15 PD1(TxD) (io), 16 PD2(INT0) (io), 17 PD3(INT1) (io), 18 PD4(OC1B) (io), 19 PD5(OC1A) (io), 20 PD6(ICP) (io), 21 (OC2)PD7 (io), 22 (SCL)PC0 (io), 23 (SDA)PC1 (io), 24 (TCK)PC2 (io), 25 (TMS)PC3 (io), 26 (TDO)PC4 (io), 27 (TDI)PC5 (io), 28 (TOSC1)PC6 (io), 29 (TOSC2)PC7 (io), 30 AVCC, 31 AGND, 32 AREF, 33 (ADC7)PA7 (io), 34 (ADC6)PA6 (io), 35 (ADC5)PA5 (io), 36 (ADC4)PA4 (io), 37 (ADC3)PA3 (io), 38 (ADC2)PA2 (io), 39 (ADC1)PA1 (io), 40 (ADC0)PA0 (io)

## AVR.ATmega323-TQ44
designator IC?  (value not drawn)
Manufacturer: Atmel; Flash: Kb; SRAM: Bytes; Volt: V; CPU Speed (MIPS): 0 MIPS; ComponentLink1Description: Degikey Part link; ComponentLink2Description: Open DataSheet; ComponentLink2URL: H:\LIBRARY\LIBRARY.Datasheet\; Publisher: Hoang Nguyen
footprint TQFP44
pins: 1 PB5(MOSI) (io), 2 PB6[MISO) (io), 3 PB7[SCK) (io), 4 ~{RESET} (in), 5 VCC, 6 GND, 7 XTAL2, 8 XTAL1, 9 (RxD)PD0 (io), 10 (TxD)PD1 (io), 11 (INT0)PD2 (io), 12 (INT1)PD3 (io), 13 (OC1B)PD4 (io), 14 (OC1A)PD5 (io), 15 (ICP)PD6 (io), 16 (OC2)PD7 (io), 17 VCC, 18 GND, 19 (SCL)PC0 (io), 20 (SDA)PC1 (io), 21 (TCK)PC2 (io), 22 (TMS)PC3 (io), 23 (TDO)PC4 (io), 24 (TDI)PC5 (io), 25 (TOSC1)PC6 (io), 26 (TOSC2)PC7 (io), 27 AVCC, 28 AGND, 29 AREF, 30 PA7(ADC7) (io), 31 PA6(ADC6) (io), 32 PA5(ADC5) (io), 33 PA4(ADC4) (io), 34 PA3(ADC3) (io), 35 PA2(ADC2) (io), 36 PA1(ADC1) (io), 37 PA0(ADC0) (io), 38 VCC, 39 GND, 40 PB0(T0/XCK) (io), 41 PB1(T1) (io), 42 PB2(INT2/AIN0) (io), 43 PB3(OC0/AIN1) (io), 44 PB4(~{SS}) (io)

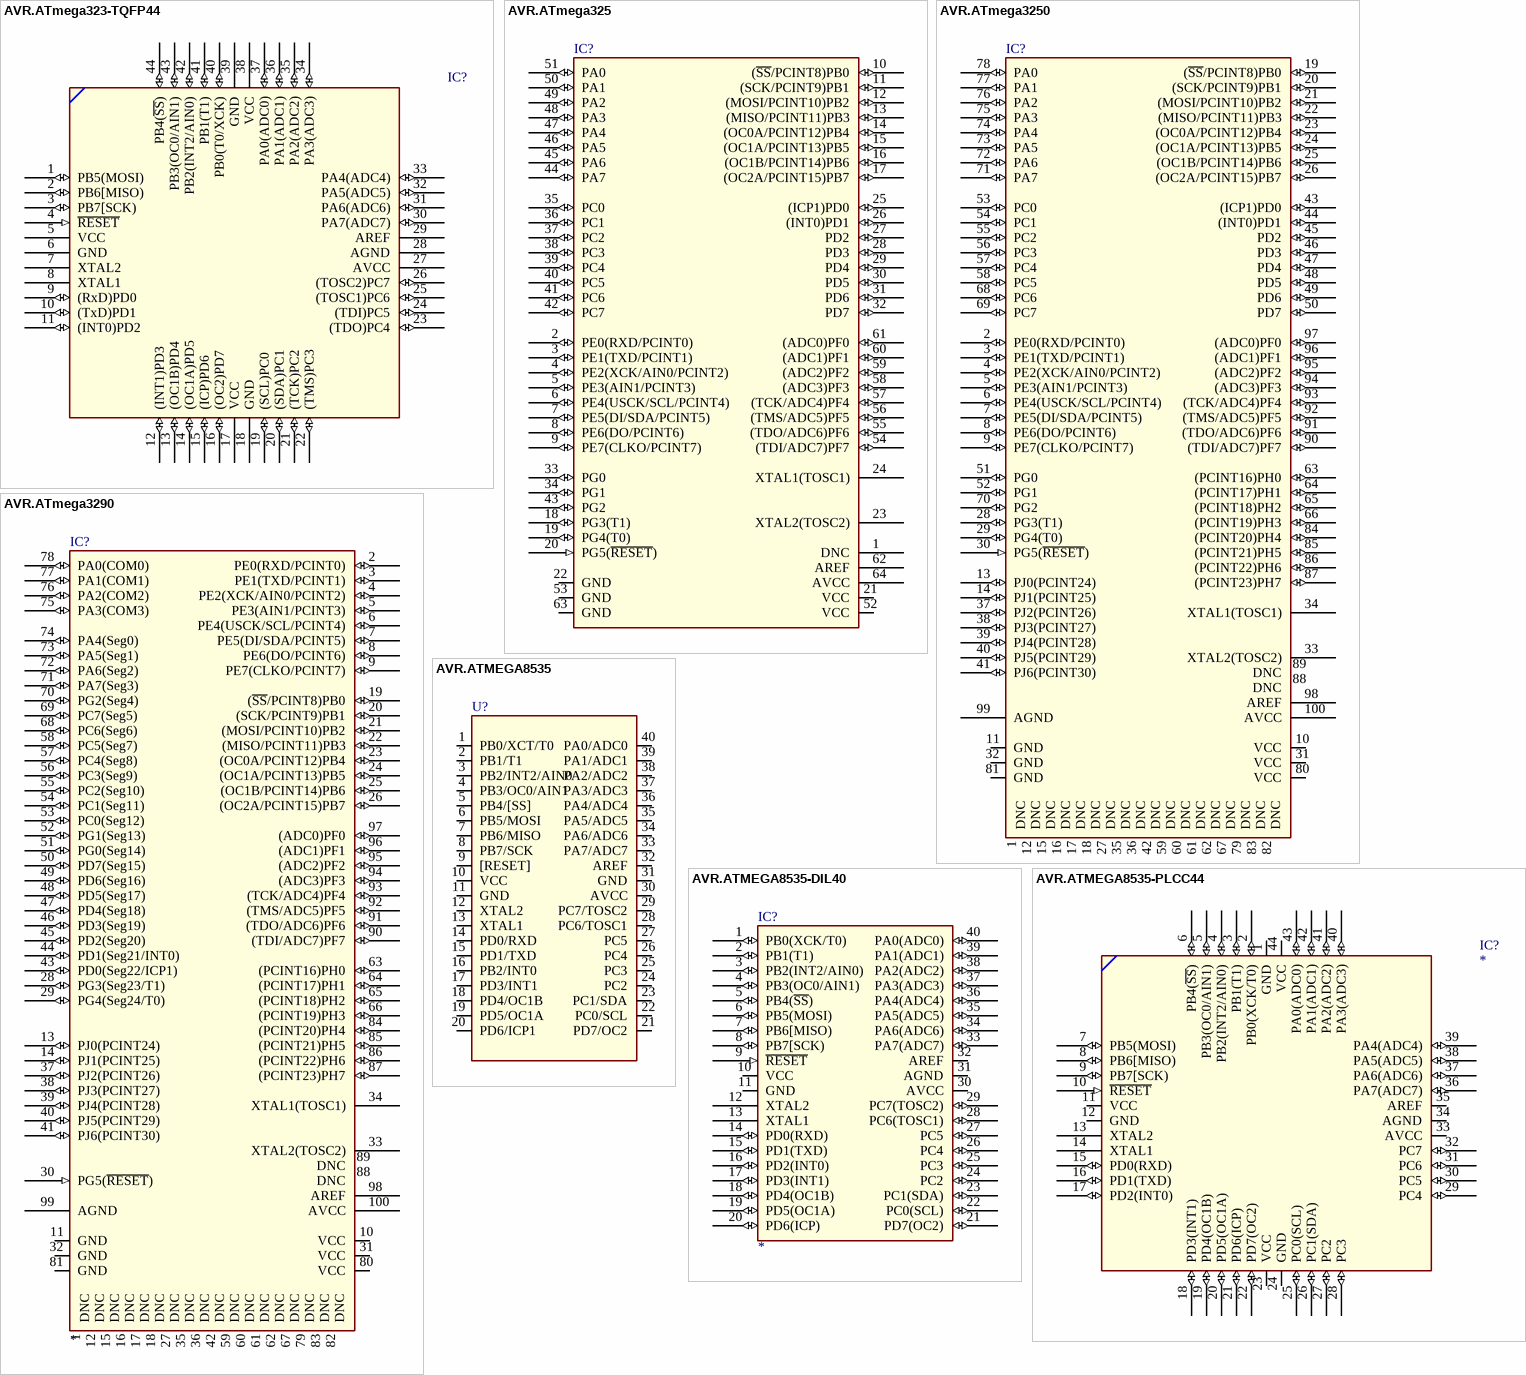
[diagram p9: symbols AVR.ATmega323-TQFP44 to AVR.ATMEGA8535-PLCC44]

## AVR.ATmega323-TQFP44
designator IC?  (value not drawn)
Manufacturer: Atmel; Flash: Kb; SRAM: Bytes; Volt: V; CPU Speed (MIPS): 0 MIPS; ComponentLink1Description: Degikey Part link; ComponentLink2Description: Open DataSheet; ComponentLink2URL: H:\LIBRARY\LIBRARY.Datasheet\; Publisher: Hoang Nguyen
footprint TQFP44
pins: 1 PB5(MOSI) (io), 2 PB6[MISO) (io), 3 PB7[SCK) (io), 4 ~{RESET} (in), 5 VCC, 6 GND, 7 XTAL2, 8 XTAL1, 9 (RxD)PD0 (io), 10 (TxD)PD1 (io), 11 (INT0)PD2 (io), 12 (INT1)PD3 (io), 13 (OC1B)PD4 (io), 14 (OC1A)PD5 (io), 15 (ICP)PD6 (io), 16 (OC2)PD7 (io), 17 VCC, 18 GND, 19 (SCL)PC0 (io), 20 (SDA)PC1 (io), 21 (TCK)PC2 (io), 22 (TMS)PC3 (io), 23 (TDO)PC4 (io), 24 (TDI)PC5 (io), 25 (TOSC1)PC6 (io), 26 (TOSC2)PC7 (io), 27 AVCC, 28 AGND, 29 AREF, 30 PA7(ADC7) (io), 31 PA6(ADC6) (io), 32 PA5(ADC5) (io), 33 PA4(ADC4) (io), 34 PA3(ADC3) (io), 35 PA2(ADC2) (io), 36 PA1(ADC1) (io), 37 PA0(ADC0) (io), 38 VCC, 39 GND, 40 PB0(T0/XCK) (io), 41 PB1(T1) (io), 42 PB2(INT2/AIN0) (io), 43 PB3(OC0/AIN1) (io), 44 PB4(~{SS}) (io)

## AVR.ATmega325
designator IC?  (value not drawn)
Manufacturer: Atmel; Flash: Kb; SRAM: Bytes; Volt: V; CPU Speed (MIPS): 0 MIPS; ComponentLink1Description: Degikey Part link; ComponentLink2Description: Open DataSheet; ComponentLink2URL: H:\LIBRARY\LIBRARY.Datasheet\; Publisher: Hoang Nguyen
footprint TQFP/MLF64
pins: 1 DNC, 2 PE0(RXD/PCINT0) (io), 3 PE1(TXD/PCINT1) (io), 4 PE2(XCK/AIN0/PCINT2) (io), 5 PE3(AIN1/PCINT3) (io), 6 PE4(USCK/SCL/PCINT4) (io), 7 PE5(DI/SDA/PCINT5) (io), 8 PE6(DO/PCINT6) (io), 9 PE7(CLKO/PCINT7) (io), 10 (~{SS}/PCINT8)PB0 (io), 11 (SCK/PCINT9)PB1 (io), 12 (MOSI/PCINT10)PB2 (io), 13 (MISO/PCINT11)PB3 (io), 14 (OC0A/PCINT12)PB4 (io), 15 (OC1A/PCINT13)PB5 (io), 16 (OC1B/PCINT14)PB6 (io), 17 (OC2A/PCINT15)PB7 (io), 18 PG3(T1) (io), 19 PG4(T0) (io), 20 PG5(~{RESET}) (in), 21 VCC, 22 GND, 23 XTAL2(TOSC2), 24 XTAL1(TOSC1), 25 (ICP1)PD0 (io), 26 (INT0)PD1 (io), 27 PD2 (io), 28 PD3 (io), 29 PD4 (io), 30 PD5 (io), 31 PD6 (io), 32 PD7 (io), 33 PG0 (io), 34 PG1 (io), 35 PC0 (io), 36 PC1 (io), 37 PC2 (io), 38 PC3 (io), 39 PC4 (io), 40 PC5 (io), 41 PC6 (io), 42 PC7 (io), 43 PG2 (io), 44 PA7 (io), 45 PA6 (io), 46 PA5 (io), 47 PA4 (io), 48 PA3 (io), 49 PA2 (io), 50 PA1 (io), 51 PA0 (io), 52 VCC, 53 GND, 54 (TDI/ADC7)PF7 (io), 55 (TDO/ADC6)PF6 (io), 56 (TMS/ADC5)PF5 (io), 57 (TCK/ADC4)PF4 (io), 58 (ADC3)PF3 (io), 59 (ADC2)PF2 (io), 60 (ADC1)PF1 (io), 61 (ADC0)PF0 (io), 62 AREF, 63 GND, 64 AVCC
